# Altium footprint library GyokuRe.PcbLib: 1248 footprints (part 77 of 78)
Each footprint in its own frame and in the unit in brackets; x right, y up, seen from the top. Pads: shape width x height; smd on the part's side, far side on the other; paste and mask are expansions set on the pad; w line width, h text height; cw(c..) or ccw(c..) is an arc to the next point about the centre after c.
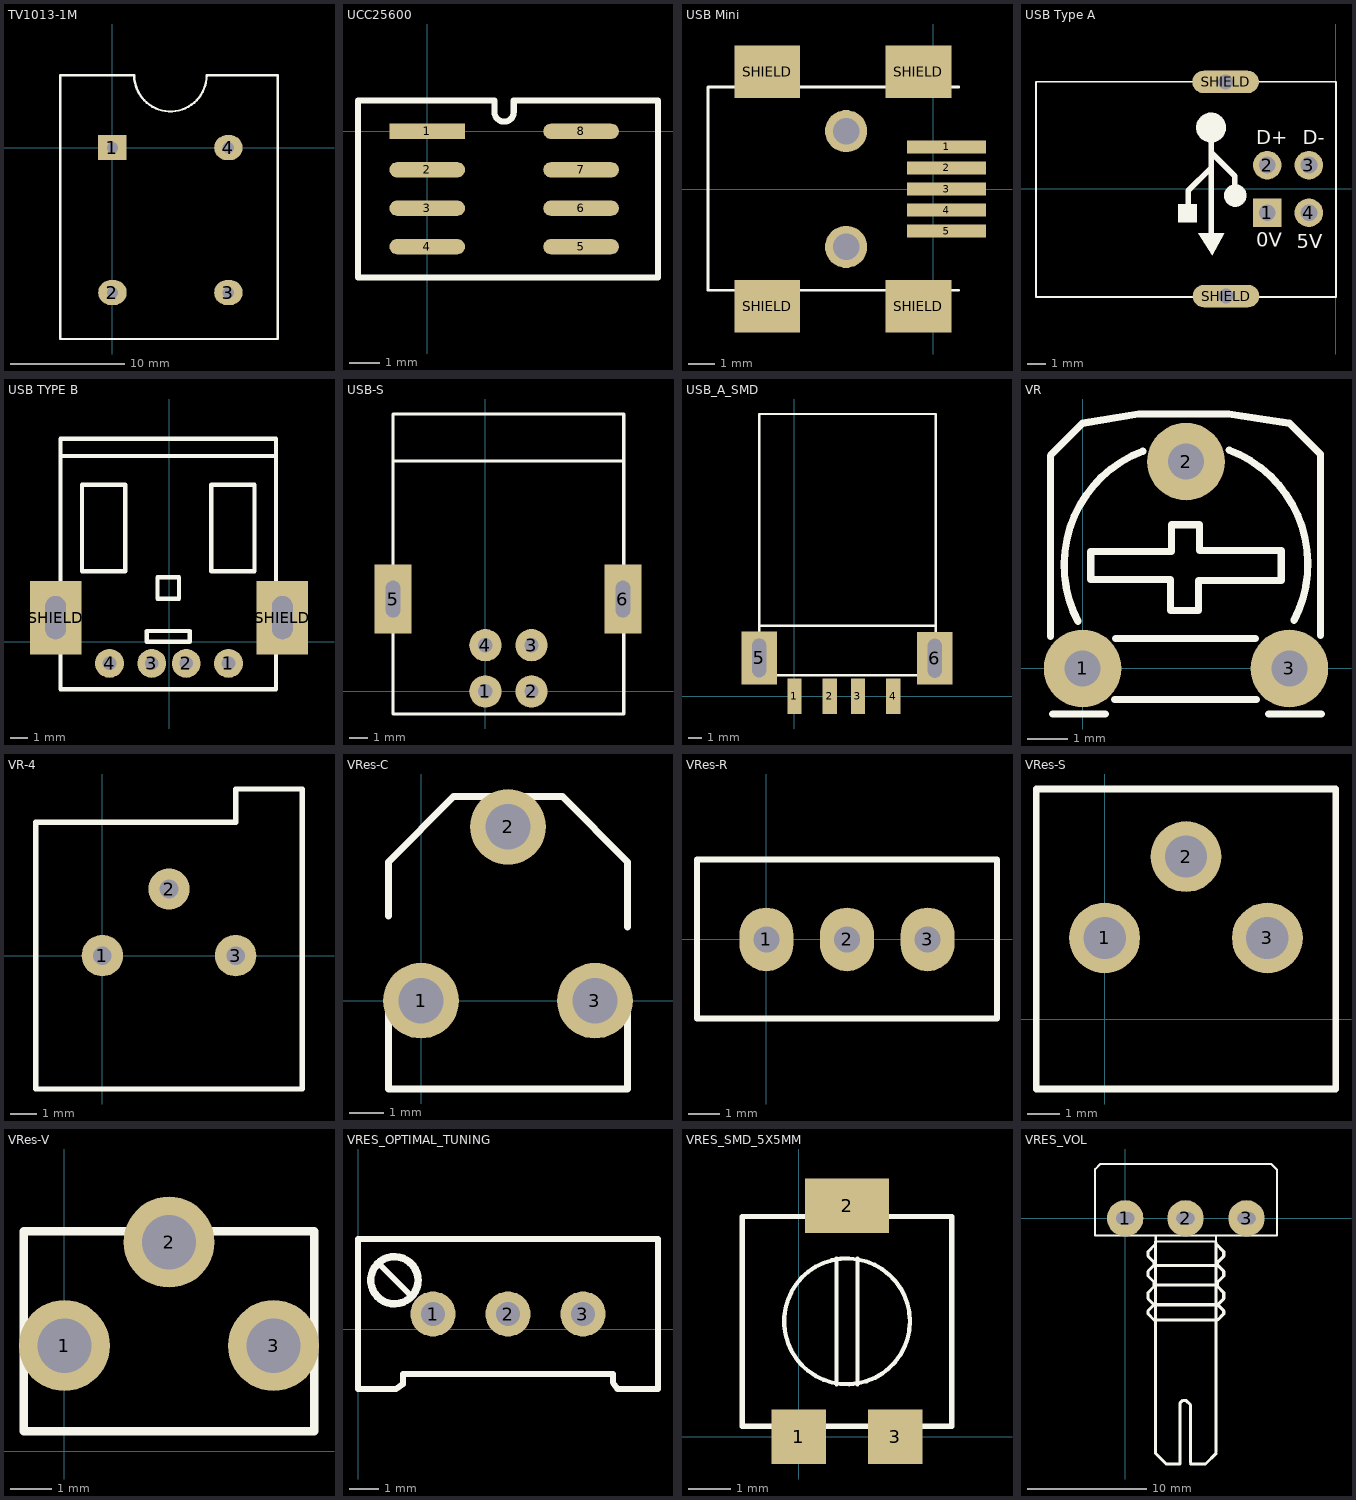
[diagram p76: the footprints below, top view; thin cyan lines are the x and y axes]

## TV1013-1M [mm]
pads (4):
  rect 2.5x2.2 / inner rect 2.5x1.2 / far side rect 2.5x2.2 hole 1: 1(0,0)
  oval 2.5x2.2 / inner oval 2.5x1.2 / far side oval 2.5x2.2 hole 1: 2(0,-12.7) 3(10.16,-12.7) 4(10.16,0)
Top Overlay:
  lines w0.2: -4.572,-16.764 14.478,-16.764 14.478,6.35 8.255,6.35 cw(c5.08,6.35) 1.905,6.35 -4.572,6.35 -4.572,-16.764

## UCC25600 [mm] "Half bridge resonant"
pads (8):
  rect 2.5x0.5 smd: 1(0,0)
  oval 2.5x0.5 smd: 2(0,-1.27) 3(0,-2.54) 4(0,-3.81) 5(5.08,-3.81) 6(5.08,-2.54) 7(5.08,-1.27) 8(5.08,0)
Top Overlay:
  lines w0.2: -2.286,-4.826 7.62,-4.826 7.62,1.016 2.857,1.016 2.857,0.635 cw(c2.54,0.635) 2.222,0.635 2.222,1.016 -2.286,1.016 -2.286,-4.826

## USB Mini [mm] "USB Male Mini Type B Conn"
pads (11):
  rect 3x0.5 smd: 1(0.5,1.6) 2(0.5,0.8) 3(0.5,0) 4(0.5,-0.8) 5(0.5,-1.6)
  rect 2.5x2 smd: SHIELD(-6.318,-4.45) SHIELD(-6.318,4.45) SHIELD(-0.568,-4.45) SHIELD(-0.568,4.45)
  round 1.6 hole 1: ""(-3.318,-2.2) ""(-3.318,2.2)
Top Overlay:
  lines w0.1: 0.957,-3.85 -8.568,-3.85 -8.568,3.875 0.957,3.875
  text "." at 1.325,2.6 h0.5
3D body "USB_mini_B.STEP": height 3.95, standoff -1, extent -9.175,-5.375 0.025,5.325

## USB Type A [mm] "USB Male Type B Connector"
pads (6):
  rect 1.524x1.524 hole 0.9: 1(-3.672,-1.27)
  round 1.524 hole 0.9: 2(-3.672,1.27) 3(-1.449,1.27) 4(-1.449,-1.27)
  rrect100% 3.556x1.2 hole 0.8: SHIELD(-5.894,5.715) SHIELD(-5.875,-5.725)
Top Overlay:
  circle w0.8: c-6.674,3.277 r0.4
  circle w0.6: c-5.382,-0.356 r0.3
  region: -8.433,-0.813 -8.433,-1.803 -7.417,-1.803 -7.417,-0.813
  region: -6.617,-3.531 -7.353,-2.362 -5.956,-2.362
  lines w0.1: -16.025,-5.775 0,-5.775 0,5.725 -16.025,5.725 -16.025,-5.775
  lines w0.2: -6.655,1.876 -6.629,1.876 -6.604,1.876
  lines w0.3: -7.899,-0.864 -7.899,-0.127 ; -7.899,-0.102 -6.655,1.143 ; -6.655,-2.464 -6.655,2.718 ; -6.604,1.876 -5.41,0.683 -5.41,-0.279
  lines w0.8: -6.934,5.725 -4.826,5.725 ; -6.915,-5.715 -4.807,-5.715
  text "5V" at -2.108,-3.175 h0.76
  text "D+" at -4.267,2.388 h0.76
  text "D-" at -1.778,2.388 h0.76
  text "0V" at -4.267,-3.099 h0.76
Bottom Overlay:
  circle w0.6: c-5.407,-0.356 r0.3
  circle w0.8: c-6.699,3.277 r0.4
  region: -8.458,-0.813 -8.458,-1.803 -7.442,-1.803 -7.442,-0.813
  region: -6.642,-3.531 -7.379,-2.362 -5.982,-2.362
  lines w0.1: -16.025,-5.775 -16.025,5.725 ; 0,-5.775 0,5.725 ; -16.025,-5.766 0,-5.766 ; -16.025,-5.766 0,-5.766 ; -16.025,-5.766 -16.025,5.725 ; -16.025,5.725 0,5.725 ; -16.025,5.725 0,5.725 ; 0,-5.766 0,5.725
  lines w0.3: -7.925,-0.864 -7.925,-0.127 ; -7.925,-0.102 -6.68,1.143 ; -6.68,-2.464 -6.68,2.718 ; -6.629,1.876 -5.436,0.683 -5.436,-0.279
3D body "USB type B.STEP": height 11.5, standoff -3.92, extent -16.594,-7.442 0.406,7.441

## USB TYPE B [mil] "Connector; USB; Type B; Solder Pad 35mil"
pads (6):
  round 67 hole 32: 1(138,-50) 2(40,-50) 3(-40,-50) 4(-138,-50)
  rect 120x170 hole 48 slot 100 at 90 deg: SHIELD(-263,56) SHIELD(263,56)
Top Overlay:
  lines w10: -251.77,-100 -251.77,431 248.23,431 248.23,-100 ; -251.77,-110 -251.77,471 248.23,471 248.23,-110 -251.77,-110 ; -201.77,164 -201.77,364 -101.77,364 -101.77,164 -201.77,164 ; -51.77,0 -51.77,25 48.23,25 48.23,0 -1.77,0 -51.77,0 ; -26.77,100 23.23,100 23.23,150 -26.77,150 -26.77,100 ; 98.23,164 98.23,364 198.23,364 198.23,164 98.23,164
3D body "usb_a-usbsa.stp": height 275.59, standoff -151.76, extent -311.02,-105 311.02,465.87

## USB-S [mil] "USB B connector, 4pin, For Print"
height 100
pads (6):
  round 70 hole 31: 1(0,0) 2(100,0) 3(100,100) 4(0,100)
  rect 80x150 hole 31 slot 80 at 90 deg: 5(-200,200) 6(298,200)
Top Overlay:
  lines w7: -200,499 300,499 ; -200,-49 -200,601 300,601 300,-49 -200,-49
3D body "usb_a-usbsb.stp": height 421.26, standoff -155.51, extent -243.31,-39.61 343.31,610

## USB_A_SMD [mil] "For USB SMD"
height 150
pads (6):
  rect 40x100 smd: 1(0,0) 2(100,0) 3(180,0) 4(280,0)
  rect 100x150 hole 40 slot 110 at 90 deg: 5(-100,109) 6(398,108)
Top Overlay:
  lines w7: -100,200 400,200 ; -100,60 400,60 400,800 -100,800 -100,60
3D body "SW3dPS-USB Series A Plug.STEP": height 73.83, standoff -103.33, extent -93.44,62.17 379,783.83

## VR [mil] "Resistor Variable"
height 200
pads (3):
  round 75 hole 35: 1(0,0) 2(100,200) 3(200,0)
Top Overlay:
  lines w7: -31,31 -31,206 0,237 54,246 141.5,246 200,237 230,207 230,32 ; -29,-44 22,-44 ; -4.35,45.34 cw(c100,100) 58.1,210.1 ; 8,113 8,86 85,86 85,56 112,56 112,85 192,85 192,114 113,114 113,139 86,139 86,113 9,113 ; 31,-30 168,-30 ; 32,29 167,29 ; 141.9,211.1 cw(c100,101) 204.35,46.34 ; 180,-44 231,-44
3D body "SW3dPS-Trimpot Horizontal.STEP": height 165.35, standoff -220.47, extent -86.85,-30 306.85,371.57

## VR-4 [mil]
pads (3):
  round 62 hole 28: 1(0,0) 2(100,100) 3(200,0)
Top Overlay:
  lines w8: -100,-200 300,-200 300,250 200,250 200,200 -100,200 -100,-200

## VRes-C [mil] "Potentiometer; 3 Leads; Circle; Solder pad 35mil"
pads (3):
  round 87 hole 52: 1(0,0) 2(100,200) 3(200,0)
Top Overlay:
  lines w8: -37.5,-90.23 -37.5,-2.73 -37.5,-101.5 237.5,-101.5 237.5,9.77 237.5,-90.23 ; -37.5,159.77 37.5,234.77 ; -37.5,159.77 -37.5,97.27 -37.5,159.77 ; -37.5,159.77 37.5,234.77 ; 37.5,234.77 162.5,234.77 ; 37.5,234.77 162.5,234.77 ; 162.5,234.77 237.5,159.77 ; 162.5,234.77 237.5,159.77 ; 237.5,159.77 237.5,84.77 237.5,159.77
3D body "User Library-Trimmer, 3306F-1.STEP": height 300, standoff -119.49, extent -34.55,-96.87 233.56,228

## VRes-R [mil] "Potentiometer; 3 Leads; Rectangle; Solder pad 35mil"
pads (3):
  oval 67x79 hole 32: 1(0,0) 2(100,0) 3(200,0)
Top Overlay:
  lines w7.87: -86,-98 286,-98 286,99 -86,99 -86,-98
3D body "User Library-Potenciometro Vertical.step": height 474.25, standoff -214.73, extent -81.1,-94 281.1,94.98

## VRes-S [mil] "Potentiometer; 3 Leads; Square; Solder pad 35mil"
pads (3):
  round 87 hole 52: 1(0,100) 2(100,200) 3(200,100)
Top Overlay:
  lines w8: -84,-85.5 284,-85.5 284,283 -84,283 -84,-85.5
3D body "SW3DPS-CERMET TRIMMER SINGLE TURN 10MM 500MW TOP ADJUST-DEFAULT.STEP": height 300, standoff -87.01, extent -87.6,-89.2 287.6,286

## VRes-V [mil] "Potentiometer; 3 Leads; Vertical; Solder pad 35mil"
pads (3):
  round 87 hole 52: 1(0,101) 2(100,200) 3(200,101)
Top Overlay:
  lines w8: -39,19 239,19 239,210.5 -39,210.5 -39,19
3D body "User Library-POT-3306W.step": height 330.71, standoff -75, extent -34.05,22.84 234.06,205.91

## VRES_OPTIMAL_TUNING [mil] "Trimmer Variable Resistor"
pads (3):
  round 60 hole 31.5: 1(100,20) 2(200,20) 3(300,20)
Top Overlay:
  circle w10: c48.5,65 r31.5
  lines w7.87: 30,85 69.37,45.63 ; 0,-80 0,120 400,120 400,-80 345.89,-80 340,-71.38 340,-60 60,-60 60,-73.61 50.64,-80 0,-80
Bottom Overlay:
  lines w7.87: 0,-80 0,120 400,120 400,-80 345.89,-80 340,-71.38 340,-60 60,-60 60,-73.61 50.64,-80 0,-80
3D body "POT.STEP": height 454.72, standoff -251.97, extent 14.4,-74 389.6,116.2

## VRES_SMD_5X5MM [mm]
pads (3):
  rect 1.3x1.3 smd: 1(0,0) 3(2.3,0)
  rect 2x1.3 smd: 2(1.15,5.5)
Top Overlay:
  circle w0.1: c1.15,2.75 r1.5
  lines w0.1: 0.9,1.25 0.9,4.25 ; 1.4,1.25 1.4,4.25
  lines w0.127: -1.35,0.25 3.65,0.25 3.65,5.25 -1.35,5.25 -1.35,0.25

## VRES_VOL [mil]
pads (3):
  round 120 hole 40 slot 60 at 0 deg: 1(0,0) 2(199,0) 3(400,0)
Top Overlay:
  lines w7: 100,-57 100,-77 299,-77 299,-57 ; 101,-77 101,-57 ; -99,-57 500,-57 500,161 482,179 -82,179 -99,162 -99,-57
  lines w10: 95,-335 75,-315 75,-305 95,-285 75,-265 75,-245 95,-225 95,-210 75,-190 75,-175 95,-155 95,-145 75,-125 75,-110 100,-85 ; 95,-220 300,-220 ; 100,-770 100,-77 ; 100,-760 100,-775 135,-810 180,-810 180,-610 190,-600 200,-600 215,-615 215,-805 ; 100,-335 305,-335 325,-315 325,-305 305,-285 ; 100,-285 305,-285 ; 105,-155 300,-155 ; 215,-810 265,-810 300,-775 ; 300,-770 300,-80 ; 300,-85 325,-110 325,-125 305,-145 305,-155 325,-175 325,-190 305,-210 305,-225 325,-245 325,-265 305,-285
3D body "SW3dPS-Pot.STEP": height 839.35, standoff -130, extent -110,-818.11 510,188.11